# Altium footprint library CPU_v1.PcbLib: 56 footprints (part 1 of 4)
Each footprint in its own frame and in the unit in brackets; x right, y up, seen from the top. Pads: shape width x height; smd on the part's side, far side on the other; paste and mask are expansions set on the pad; w line width, h text height; cw(c..) or ccw(c..) is an arc to the next point about the centre after c.
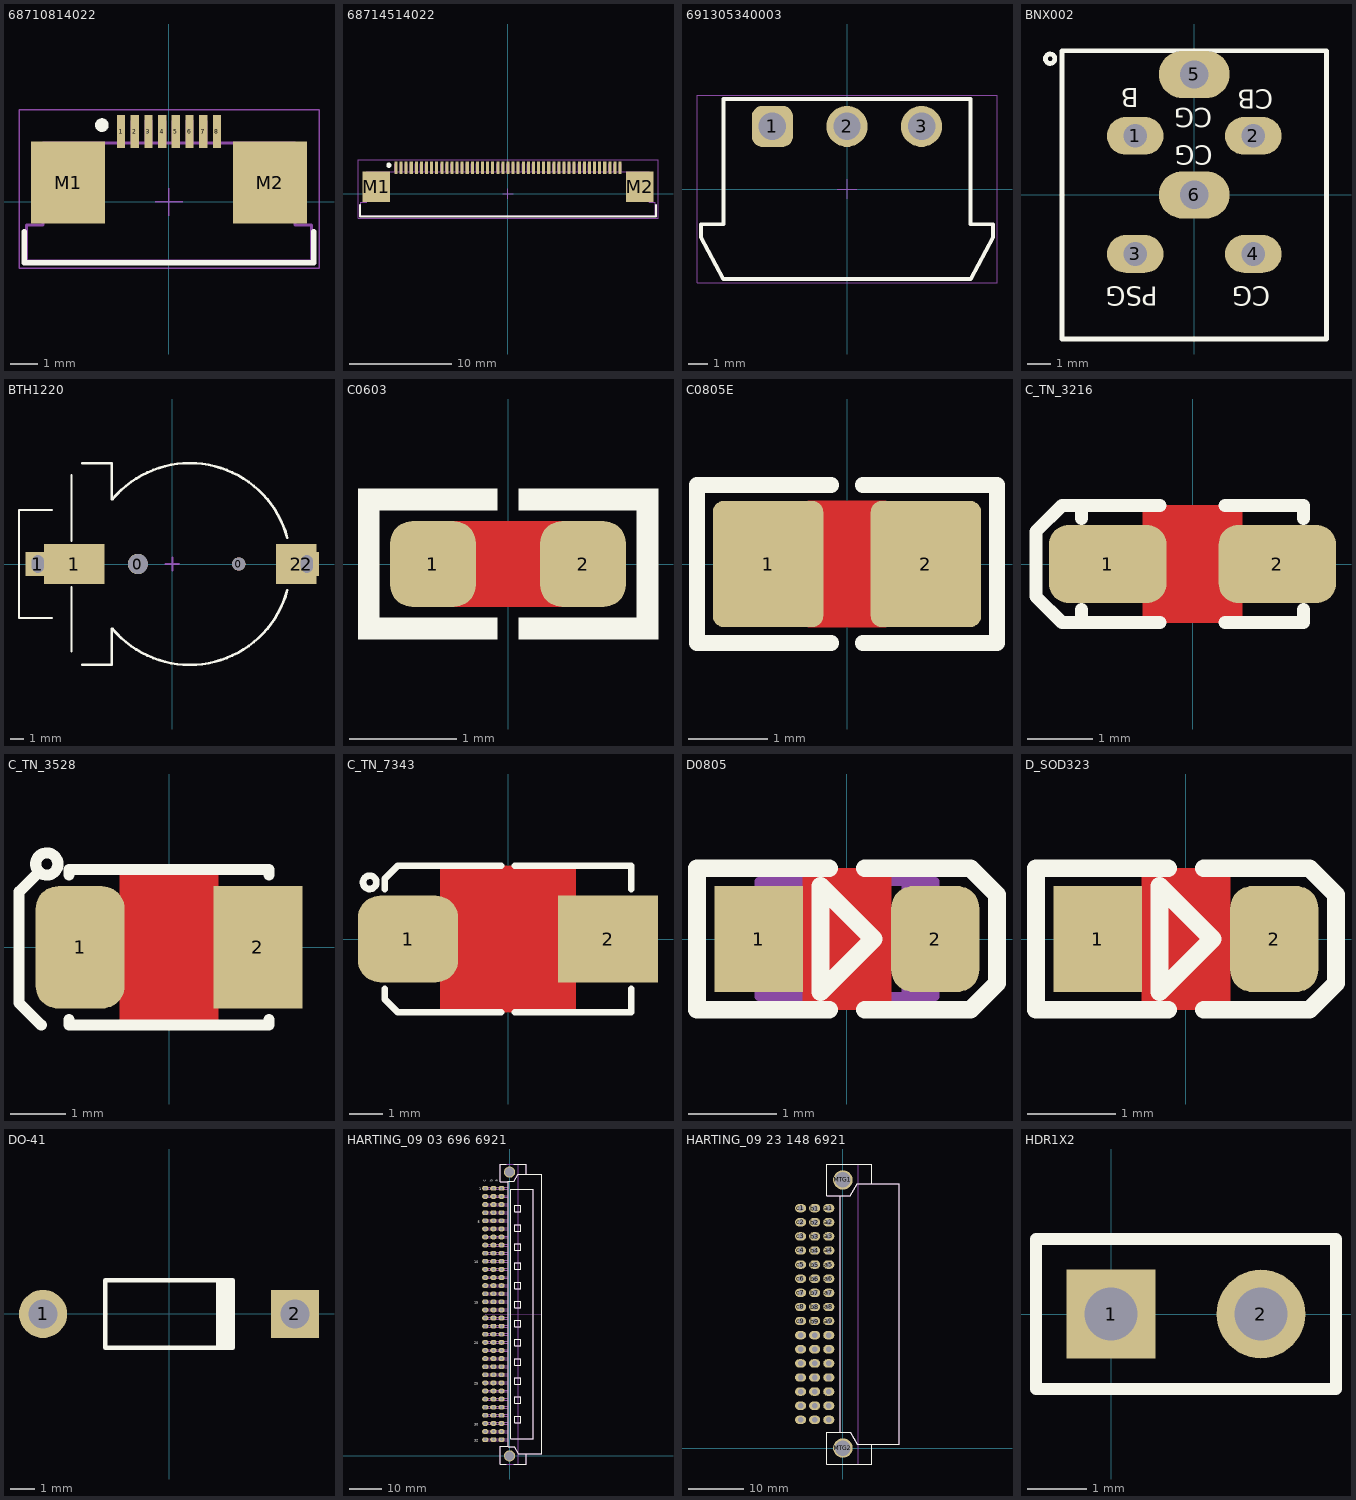
[diagram p0: the footprints below, top view; thin cyan lines are the x and y axes]

## 68710814022 [mm] "ZIF Connectors, Horizontal, Top Contact, pitch 0.5mm, 8p"
height 2.25
pads (10):
  rect 0.3x1.2 smd: 1(-1.75,2.56) 2(-1.25,2.56) 3(-0.75,2.56) 4(-0.25,2.56) 5(0.25,2.56) 6(0.75,2.56) 7(1.25,2.56) 8(1.75,2.56)
  rect 2.7x3 smd: M1(-3.68,0.7) M2(3.68,0.7)
Top Overlay:
  circle w0.25: c-2.45,2.8 r0.125
  lines w0.2: -5.275,-1.1 -5.275,-2.225 5.275,-2.225 5.275,-1.1
Top Designator:
  text ".Designator" at -2.917,-0.286 h0.8
Top Courtyard:
  lines w0.05: -0.5,0 0.5,0 ; 0,-0.5 0,0.5 ; -5.475,-2.425 5.475,-2.425 5.475,3.36 -5.475,3.36 -5.475,-2.425
Top 3D Body:
  lines w0.1: -1.85,2.15 -1.85,2.95 -1.65,2.95 -1.65,2.15 ; -1.35,2.15 -1.35,2.95 -1.15,2.95 -1.15,2.15 ; -0.85,2.15 -0.85,2.95 -0.65,2.95 -0.65,2.15 ; -0.35,2.15 -0.35,2.95 -0.15,2.95 -0.15,2.15 ; 0.15,2.15 0.15,2.95 0.35,2.95 0.35,2.15 ; 0.65,2.15 0.65,2.95 0.85,2.95 0.85,2.15 ; 1.15,2.15 1.15,2.95 1.35,2.95 1.35,2.15 ; 1.65,2.15 1.65,2.95 1.85,2.95 1.85,2.15 ; -5.2,-2.15 -5.2,-0.85 -4.6,-0.85 -4.6,2.15 4.6,2.15 4.6,-0.85 5.2,-0.85 5.2,-2.15 -5.2,-2.15
Top Component Outline:
  lines w0.1: -1.85,2.15 -1.85,2.95 -1.65,2.95 -1.65,2.15 ; -1.35,2.15 -1.35,2.95 -1.15,2.95 -1.15,2.15 ; -0.85,2.15 -0.85,2.95 -0.65,2.95 -0.65,2.15 ; -0.35,2.15 -0.35,2.95 -0.15,2.95 -0.15,2.15 ; 0.15,2.15 0.15,2.95 0.35,2.95 0.35,2.15 ; 0.65,2.15 0.65,2.95 0.85,2.95 0.85,2.15 ; 1.15,2.15 1.15,2.95 1.35,2.95 1.35,2.15 ; 1.65,2.15 1.65,2.95 1.85,2.95 1.85,2.15 ; -5.2,-2.15 5.2,-2.15 5.2,-0.85 4.6,-0.85 4.6,2.15 -4.6,2.15 -4.6,-0.85 -5.2,-0.85 -5.2,-2.15
3D body "68710814022.stp": height 2.1, standoff 0, extent -5.2,-2.15 5.2,2.95

## 68714514022 [mm] "ZIF Connectors, Horizontal, Top Contact, pitch 0.5mm, 45p"
height 2.25
pads (47):
  rect 0.3x1.2 smd: 1(-11,2.56) 2(-10.5,2.56) 3(-10,2.56) 4(-9.5,2.56) 5(-9,2.56) 6(-8.5,2.56) 7(-8,2.56) 8(-7.5,2.56) 9(-7,2.56) 10(-6.5,2.56) 11(-6,2.56) 12(-5.5,2.56) 13(-5,2.56) 14(-4.5,2.56) 15(-4,2.56) 16(-3.5,2.56) 17(-3,2.56) 18(-2.5,2.56) 19(-2,2.56) 20(-1.5,2.56) 21(-1,2.56) 22(-0.5,2.56) 23(0,2.56) 24(0.5,2.56) 25(1,2.56) 26(1.5,2.56) 27(2,2.56) 28(2.5,2.56) 29(3,2.56) 30(3.5,2.56) 31(4,2.56) 32(4.5,2.56) 33(5,2.56) 34(5.5,2.56) 35(6,2.56) 36(6.5,2.56) 37(7,2.56) 38(7.5,2.56) 39(8,2.56) 40(8.5,2.56) 41(9,2.56) 42(9.5,2.56) 43(10,2.56) 44(10.5,2.56) 45(11,2.56)
  rect 2.7x3 smd: M1(-12.93,0.7) M2(12.93,0.7)
Top Overlay:
  circle w0.25: c-11.7,2.8 r0.125
  lines w0.2: -14.525,-1.1 -14.525,-2.225 14.525,-2.225 14.525,-1.1
Top Designator:
  text ".Designator" at -2.917,-0.286 h0.8
Top Courtyard:
  lines w0.05: -0.5,0 0.5,0 ; 0,-0.5 0,0.5 ; -14.725,-2.425 14.725,-2.425 14.725,3.36 -14.725,3.36 -14.725,-2.425
Top 3D Body:
  lines w0.1: -11.1,2.15 -11.1,2.95 -10.9,2.95 -10.9,2.15 ; -10.6,2.15 -10.6,2.95 -10.4,2.95 -10.4,2.15 ; -10.1,2.15 -10.1,2.95 -9.9,2.95 -9.9,2.15 ; -9.6,2.15 -9.6,2.95 -9.4,2.95 -9.4,2.15 ; -9.1,2.15 -9.1,2.95 -8.9,2.95 -8.9,2.15 ; -8.6,2.15 -8.6,2.95 -8.4,2.95 -8.4,2.15 ; -8.1,2.15 -8.1,2.95 -7.9,2.95 -7.9,2.15 ; -7.6,2.15 -7.6,2.95 -7.4,2.95 -7.4,2.15 ; -7.1,2.15 -7.1,2.95 -6.9,2.95 -6.9,2.15 ; -6.6,2.15 -6.6,2.95 -6.4,2.95 -6.4,2.15 ; -6.1,2.15 -6.1,2.95 -5.9,2.95 -5.9,2.15 ; -5.6,2.15 -5.6,2.95 -5.4,2.95 -5.4,2.15 ; -5.1,2.15 -5.1,2.95 -4.9,2.95 -4.9,2.15 ; -4.6,2.15 -4.6,2.95 -4.4,2.95 -4.4,2.15 ; -4.1,2.15 -4.1,2.95 -3.9,2.95 -3.9,2.15 ; -3.6,2.15 -3.6,2.95 -3.4,2.95 -3.4,2.15 ; -3.1,2.15 -3.1,2.95 -2.9,2.95 -2.9,2.15 ; -2.6,2.15 -2.6,2.95 -2.4,2.95 -2.4,2.15 ; -2.1,2.15 -2.1,2.95 -1.9,2.95 -1.9,2.15 ; -1.6,2.15 -1.6,2.95 -1.4,2.95 -1.4,2.15 ; -1.1,2.15 -1.1,2.95 -0.9,2.95 -0.9,2.15 ; -0.6,2.15 -0.6,2.95 -0.4,2.95 -0.4,2.15 ; -0.1,2.15 -0.1,2.95 0.1,2.95 0.1,2.15 ; 0.4,2.15 0.4,2.95 0.6,2.95 0.6,2.15 ; 0.9,2.15 0.9,2.95 1.1,2.95 1.1,2.15 ; 1.4,2.15 1.4,2.95 1.6,2.95 1.6,2.15 ; 1.9,2.15 1.9,2.95 2.1,2.95 2.1,2.15 ; 2.4,2.15 2.4,2.95 2.6,2.95 2.6,2.15 ; 2.9,2.15 2.9,2.95 3.1,2.95 3.1,2.15 ; 3.4,2.15 3.4,2.95 3.6,2.95 3.6,2.15 ; 3.9,2.15 3.9,2.95 4.1,2.95 4.1,2.15 ; 4.4,2.15 4.4,2.95 4.6,2.95 4.6,2.15 ; 4.9,2.15 4.9,2.95 5.1,2.95 5.1,2.15 ; 5.4,2.15 5.4,2.95 5.6,2.95 5.6,2.15 ; 5.9,2.15 5.9,2.95 6.1,2.95 6.1,2.15 ; 6.4,2.15 6.4,2.95 6.6,2.95 6.6,2.15 ; 6.9,2.15 6.9,2.95 7.1,2.95 7.1,2.15 ; 7.4,2.15 7.4,2.95 7.6,2.95 7.6,2.15 ; 7.9,2.15 7.9,2.95 8.1,2.95 8.1,2.15 ; 8.4,2.15 8.4,2.95 8.6,2.95 8.6,2.15 ; 8.9,2.15 8.9,2.95 9.1,2.95 9.1,2.15 ; 9.4,2.15 9.4,2.95 9.6,2.95 9.6,2.15 ; 9.9,2.15 9.9,2.95 10.1,2.95 10.1,2.15 ; 10.4,2.15 10.4,2.95 10.6,2.95 10.6,2.15 ; 10.9,2.15 10.9,2.95 11.1,2.95 11.1,2.15 ; -14.45,-2.15 -14.45,-0.85 -13.85,-0.85 -13.85,2.15 13.85,2.15 13.85,-0.85 14.45,-0.85 14.45,-2.15 -14.45,-2.15
Top Component Outline:
  lines w0.1: -11.1,2.15 -11.1,2.95 -10.9,2.95 -10.9,2.15 ; -10.6,2.15 -10.6,2.95 -10.4,2.95 -10.4,2.15 ; -10.1,2.15 -10.1,2.95 -9.9,2.95 -9.9,2.15 ; -9.6,2.15 -9.6,2.95 -9.4,2.95 -9.4,2.15 ; -9.1,2.15 -9.1,2.95 -8.9,2.95 -8.9,2.15 ; -8.6,2.15 -8.6,2.95 -8.4,2.95 -8.4,2.15 ; -8.1,2.15 -8.1,2.95 -7.9,2.95 -7.9,2.15 ; -7.6,2.15 -7.6,2.95 -7.4,2.95 -7.4,2.15 ; -7.1,2.15 -7.1,2.95 -6.9,2.95 -6.9,2.15 ; -6.6,2.15 -6.6,2.95 -6.4,2.95 -6.4,2.15 ; -6.1,2.15 -6.1,2.95 -5.9,2.95 -5.9,2.15 ; -5.6,2.15 -5.6,2.95 -5.4,2.95 -5.4,2.15 ; -5.1,2.15 -5.1,2.95 -4.9,2.95 -4.9,2.15 ; -4.6,2.15 -4.6,2.95 -4.4,2.95 -4.4,2.15 ; -4.1,2.15 -4.1,2.95 -3.9,2.95 -3.9,2.15 ; -3.6,2.15 -3.6,2.95 -3.4,2.95 -3.4,2.15 ; -3.1,2.15 -3.1,2.95 -2.9,2.95 -2.9,2.15 ; -2.6,2.15 -2.6,2.95 -2.4,2.95 -2.4,2.15 ; -2.1,2.15 -2.1,2.95 -1.9,2.95 -1.9,2.15 ; -1.6,2.15 -1.6,2.95 -1.4,2.95 -1.4,2.15 ; -1.1,2.15 -1.1,2.95 -0.9,2.95 -0.9,2.15 ; -0.6,2.15 -0.6,2.95 -0.4,2.95 -0.4,2.15 ; -0.1,2.15 -0.1,2.95 0.1,2.95 0.1,2.15 ; 0.4,2.15 0.4,2.95 0.6,2.95 0.6,2.15 ; 0.9,2.15 0.9,2.95 1.1,2.95 1.1,2.15 ; 1.4,2.15 1.4,2.95 1.6,2.95 1.6,2.15 ; 1.9,2.15 1.9,2.95 2.1,2.95 2.1,2.15 ; 2.4,2.15 2.4,2.95 2.6,2.95 2.6,2.15 ; 2.9,2.15 2.9,2.95 3.1,2.95 3.1,2.15 ; 3.4,2.15 3.4,2.95 3.6,2.95 3.6,2.15 ; 3.9,2.15 3.9,2.95 4.1,2.95 4.1,2.15 ; 4.4,2.15 4.4,2.95 4.6,2.95 4.6,2.15 ; 4.9,2.15 4.9,2.95 5.1,2.95 5.1,2.15 ; 5.4,2.15 5.4,2.95 5.6,2.95 5.6,2.15 ; 5.9,2.15 5.9,2.95 6.1,2.95 6.1,2.15 ; 6.4,2.15 6.4,2.95 6.6,2.95 6.6,2.15 ; 6.9,2.15 6.9,2.95 7.1,2.95 7.1,2.15 ; 7.4,2.15 7.4,2.95 7.6,2.95 7.6,2.15 ; 7.9,2.15 7.9,2.95 8.1,2.95 8.1,2.15 ; 8.4,2.15 8.4,2.95 8.6,2.95 8.6,2.15 ; 8.9,2.15 8.9,2.95 9.1,2.95 9.1,2.15 ; 9.4,2.15 9.4,2.95 9.6,2.95 9.6,2.15 ; 9.9,2.15 9.9,2.95 10.1,2.95 10.1,2.15 ; 10.4,2.15 10.4,2.95 10.6,2.95 10.6,2.15 ; 10.9,2.15 10.9,2.95 11.1,2.95 11.1,2.15 ; -14.45,-2.15 14.45,-2.15 14.45,-0.85 13.85,-0.85 13.85,2.15 -13.85,2.15 -13.85,-0.85 -14.45,-0.85 -14.45,-2.15
3D body "68714514022.stp": height 2.1, standoff 0, extent -14.45,-2.15 14.45,2.95

## 691305340003 [mm] "Horizontal PCB Header with Plastic Latch, pitch 3.81mm, 03p"
height 7
pads (3):
  rrect50% 2.1x2.1 hole 1.4: 1(-3.81,3.2)
  round 2.1 hole 1.4: 2(0,3.2) 3(3.81,3.2)
Top Overlay:
  lines w0.2: -7.467,-2.451 -6.315,-4.6 6.315,-4.6 7.467,-2.451 ; -7.465,-2.45 -7.465,-1.8 -6.315,-1.8 -6.315,4.6 6.315,4.6 6.315,-1.8 7.465,-1.8 7.465,-2.45
Top Designator:
  text ".Designator" at -7.498,-0.5 h1.5
Top Courtyard:
  lines w0.05: -7.665,-4.8 7.665,-4.8 7.665,4.8 -7.665,4.8 -7.665,-4.8
Top 3D Body:
  lines w0.1: -7.467,-2.451 -6.315,-4.6 6.315,-4.6 7.467,-2.451 ; -7.465,-2.45 -7.465,-1.8 -6.315,-1.8 -6.315,4.6 6.315,4.6 6.315,-1.8 7.465,-1.8 7.465,-2.45
Top Component Center:
  lines w0.05: -0.5,0 0.5,0 ; 0,-0.5 0,0.5
Top Component Outline:
  lines w0.1: -7.467,-2.451 -6.315,-4.6 6.315,-4.6 7.467,-2.451 ; -7.465,-2.45 -7.465,-1.8 -6.315,-1.8 -6.315,4.6 6.315,4.6 6.315,-1.8 7.465,-1.8 7.465,-2.45
3D body "691305340003.stp": height 7.25, standoff -3.45, extent -7.46,-4.6 7.46,4.6

## BNX002 [mm] "MURATA EMIFIL"
height 15
pads (6):
  oval 2.4x1.6 hole 1: 1(-2.5,2.5) 2(2.5,2.5) 3(-2.5,-2.5) 4(2.5,-2.5)
  oval 3x2 hole 1.2: 5(0,5.1) 6(0,0)
Top Overlay:
  circle w0.2: c-6.102,5.764 r0.2
  lines w0.2: -5.6,-6.1 5.6,-6.1 5.6,6.1 -5.6,6.1 -5.6,-6.1
  text "CG" at 0.758,3.671 h0.8
  text "CG" at 0.783,2.071 h0.8
  text "PSG" at -1.554,-3.898 h0.8
  text "CG" at 3.222,-3.898 h0.8
  text "CB" at 3.349,4.458 h0.8
  text "B" at -2.341,4.509 h0.8
3D body "User Library-Murata_BNX002.STEP": height 12.5, standoff -5, extent -5.5,-6 5.5,6

## BTH1220 [mm] "COIN CELL BATTERY HOLDER 1220 12mm CR1220"
height 2
pads (6):
  round 1.5 hole 1.5 unplated: 0(-2.563,0)
  round 1 hole 1 unplated: 0(4.93,0)
  rect 1.8x1.8 hole 0.9 slot 1.3 at 90 deg: 1(-10,0) 2(10,0)
  rect 4.5x3 smd: 1(-7.3,0)
  rect 3x3 smd: 2(9.2,0)
Top Overlay:
  lines w0.15: -8.962,4 -11.4,4 -11.4,-4 -8.954,-4 ; -7.5,-6.5 -7.5,-1.7 ; -7.5,1.7 -7.5,6.6
  lines w0.2: -6.7,-7.5 -4.5,-7.5 -4.5,-4.821 ; -6.7,7.5 -4.5,7.5 -4.5,4.821 ; -4.445,-4.821 ccw(c1.3,0) 8.544,-1.941 ; -4.445,4.821 cw(c1.3,0) 8.544,1.941
Mechanical 15:
  lines w0.15: -0.5,0 0.5,0 ; 0,-0.5 0,0.5
3D body "User Library-Battery Holder for CR1220 SMD.step": height 4.28, standoff -0.47, extent -8.46,-7.389 10.341,7.36

## C0603 [mm] "CHIP Capacitor, 1.6X0.8mm, 0603 OPTIMIZED"
height 0.6
pads (2):
  rrect50% 0.8x0.8 smd paste-5 mask+0.075: 1(-0.7,0) 2(0.7,0)
Top Layer:
  pour cut-out: -0.5,0.4 0.5,0.4 0.5,-0.4 -0.5,-0.4
Top Overlay:
  region: 0.1,-0.5 0.1,-0.7 1.4,-0.7 1.4,-0.5
  region: 0.1,0.5 0.1,0.7 1.4,0.7 1.4,0.5
  region: 1.4,0.7 1.2,0.7 1.2,-0.7 1.4,-0.7
  region: -1.4,0.7 -1.2,0.7 -1.2,-0.7 -1.4,-0.7
  region: -0.1,0.5 -0.1,0.7 -1.4,0.7 -1.4,0.5
  region: -0.1,-0.5 -0.1,-0.7 -1.4,-0.7 -1.4,-0.5
Top Paste:
  region: -0.7,0.35 -0.63,0.35 -0.502,0.297 -0.403,0.198 -0.35,0.07 -0.35,0 -0.35,-0.07 -0.403,-0.198 -0.502,-0.297 -0.63,-0.35 -0.7,-0.35 -0.9,-0.35 -0.93,-0.35 -0.985,-0.327 -1.027,-0.285 -1.05,-0.23 -1.05,-0.2 -1.05,0.2 -1.05,0.23 -1.027,0.285 -0.985,0.327 -0.93,0.35 -0.9,0.35
  region: 0.7,0.35 0.63,0.35 0.502,0.297 0.403,0.198 0.35,0.07 0.35,0 0.35,-0.07 0.403,-0.198 0.502,-0.297 0.63,-0.35 0.7,-0.35 0.9,-0.35 0.93,-0.35 0.985,-0.327 1.027,-0.285 1.05,-0.23 1.05,-0.2 1.05,0.2 1.05,0.23 1.027,0.285 0.985,0.327 0.93,0.35 0.9,0.35
3D body "User Library-CAPC1608X09.step": height 0.9, standoff 0, extent -0.8,-0.4 0.8,0.4

## C0805E [mm] "CHIP Capacitor, 2.0X1.3mm, 0805, EXPANDED PAD"
height 2.25
pads (2):
  rrect20% 1.4x1.6 smd mask+0.1: 1(-1,0) 2(1,0)
Top Layer:
  pour cut-out: -0.5,0.8 0.5,0.8 0.5,-0.8 -0.5,-0.8
Top Overlay:
  lines w0.2: -0.2,-1 -1.9,-1 -1.9,1 -0.2,1 ; 0.2,-1 1.9,-1 1.9,1 0.2,1
3D body "User Library-CAPC2013X10.step": height 1, standoff 0, extent -1,-0.625 1,0.625

## C_TN_3216 [mm] "CAPACITOR, TAN A, 1206P, 3.2x1.6mm"
height 1.8
pads (2):
  rrect50% 1.8x1.2 smd mask+0.075: 1(-1.3,0) 2(1.3,0)
Top Layer:
  pour cut-out: -0.762,0.9 0.762,0.9 0.762,-0.9 -0.762,-0.9
Top Overlay:
  lines w0.2: -1.7,-0.7 -1.7,-0.9 ; -1.7,0.7 -1.7,0.9 ; -0.5,-0.9 -1.7,-0.9 ; -0.5,0.9 -1.7,0.9 ; 0.5,-0.9 1.7,-0.9 1.7,-0.7 ; 0.5,0.9 1.7,0.9 1.7,0.7 ; -1.7,-0.9 -2,-0.9 -2.4,-0.5 -2.4,0.5 -2,0.9 -1.7,0.9
3D body "User Library-CAP_TANT_3216-18_A_case-1.step": height 1.7, standoff 0, extent -1.7,-0.9 1.7,0.9

## C_TN_3528 [mm] "CAPACITOR, TAN B, TAN H, TAN T, TAN M, 3528P, 1210P, 3.5X2.8mm"
height 13.1
pads (2):
  rrect50% 1.6x2.2 smd mask+0.1: 1(-1.6,0)
  rect 1.6x2.2 smd mask+0.1: 2(1.6,0)
Top Layer:
  pour cut-out: -0.889,1.4 -0.889,-1.4 0.889,-1.4 0.889,1.4
Top Overlay:
  circle w0.2: c-2.2,1.5 r0.2
  lines w0.2: -2.35,1.35 -2.7,1 -2.7,-1 -2.3,-1.4 ; -1.8,-1.3 -1.8,-1.4 1.8,-1.4 1.8,-1.3 ; -1.8,1.3 -1.8,1.4 1.8,1.4 1.8,1.3
3D body "User Library-AVX_BCASE.step": height 2.03, standoff 0, extent -1.85,-1.465 1.85,1.465

## C_TN_7343 [mm] "CAPACITOR, TAN D, TAN E, TAN Y, TAN X, 7343P, 7.3X4.3mm"
height 4.3
pads (2):
  rrect50% 3x2.6 smd: 1(-3,0)
  rect 3x2.6 smd: 2(3,0)
Top Layer:
  pour cut-out: -2.032,2.2 -2.032,-2.2 2.032,-2.2 2.032,2.2
Top Overlay:
  circle w0.2: c-4.15,1.7 r0.2
  lines w0.2: -3.7,-1.5 -3.7,-1.8 -3.3,-2.2 -0.2,-2.2 ; -3.7,1.5 -3.7,1.8 -3.3,2.2 -0.2,2.2 ; 0.2,-2.2 3.7,-2.2 3.7,-1.5 ; 0.2,2.2 3.7,2.2 3.7,1.5
3D body "User Library-AVX_E_CASE.step": height 4.2, standoff 0, extent -3.7,-2.225 3.701,2.225

## D0805 [mm] "DIODE0805, SOD323 (PHILIPS), SC-76 (JEITA), DL-35, MicroMELF"
height 1.4
pads (2):
  rect 1x1.2 smd paste-2 mask+0.075: 1(-1,0)
  rrect50% 1x1.2 smd paste-2 mask+0.075: 2(1,0)
Top Layer:
  pour cut-out: -0.5,0.8 0.5,0.8 0.5,-0.8 -0.5,-0.8
Top Overlay:
  lines w0.2: -0.2,-0.8 -1.7,-0.8 -1.7,0.8 -0.2,0.8 ; 0.2,-0.8 1.4,-0.8 1.7,-0.5 1.7,0.5 1.4,0.8 0.2,0.8 ; -0.3,-0.6 -0.3,0.6 0.3,0 -0.3,-0.6
Top Paste:
  region: -0.9,0.5 -0.82,0.5 -0.673,0.439 -0.561,0.327 -0.5,0.18 -0.5,0.1 -0.5,-0.1 -0.5,-0.18 -0.561,-0.327 -0.673,-0.439 -0.82,-0.5 -0.9,-0.5 -1.15,-0.5 -1.18,-0.5 -1.235,-0.477 -1.277,-0.435 -1.3,-0.38 -1.3,-0.35 -1.3,0.35 -1.3,0.38 -1.277,0.435 -1.235,0.477 -1.18,0.5 -1.15,0.5
  region: 0.9,0.5 0.82,0.5 0.673,0.439 0.561,0.327 0.5,0.18 0.5,0.1 0.5,-0.1 0.5,-0.18 0.561,-0.327 0.673,-0.439 0.82,-0.5 0.9,-0.5 1.15,-0.5 1.18,-0.5 1.235,-0.477 1.277,-0.435 1.3,-0.38 1.3,-0.35 1.3,0.35 1.3,0.38 1.277,0.435 1.235,0.477 1.18,0.5 1.15,0.5
Mechanical 13:
  rectangle: -0.848,-0.65 -0.619,0.65
  rectangle: -0.995,0.193 -0.842,0.652
  rectangle: -0.995,-0.648 -0.842,-0.188
  region: 0.848,0.65 0.619,0.65 0.619,-0.65 0.848,-0.65
  region: 0.995,0.648 0.842,0.648 0.842,0.188 0.995,0.188
  region: 0.995,-0.193 0.842,-0.193 0.842,-0.652 0.995,-0.652
  lines w0.102: -0.305,0.356 -0.076,0.025 -0.33,0 -0.076,-0.33 ; 0.102,0.356 0.33,0.025 0.076,0 0.33,-0.33 ; -0.076,-0.33 -0.076,-0.178 -0.229,-0.279 -0.076,-0.33 ; 0.33,-0.33 0.33,-0.178 0.178,-0.279 0.33,-0.33 ; -1,-0.65 1,-0.65 1,-0.19 cw(c1,0) 1,0.191 1,0.65 -1,0.65 -1,0.191 cw(c-1,0) -1,-0.191 -1,-0.65
3D body "SOD-323.STEP": height 1.17, standoff 0.03, extent -1.43,-0.8 1.43,0.7

## D_SOD323 [mm] "DIODE0805, SOD-323, SC-76, DL-35, 0805 similar size"
height 1.4
pads (2):
  rect 1x1.2 smd paste-2 mask+0.075: 1(-1,0)
  rrect50% 1x1.2 smd paste-2 mask+0.075: 2(1,0)
Top Layer:
  pour cut-out: -0.5,0.8 0.5,0.8 0.5,-0.8 -0.5,-0.8
Top Overlay:
  lines w0.2: -0.2,-0.8 -1.7,-0.8 -1.7,0.8 -0.2,0.8 ; 0.2,-0.8 1.4,-0.8 1.7,-0.5 1.7,0.5 1.4,0.8 0.2,0.8 ; -0.3,-0.6 -0.3,0.6 0.3,0 -0.3,-0.6
Top Paste:
  region: 0.9,0.5 0.82,0.5 0.673,0.439 0.561,0.327 0.5,0.18 0.5,0.1 0.5,-0.1 0.5,-0.18 0.561,-0.327 0.673,-0.439 0.82,-0.5 0.9,-0.5 1.15,-0.5 1.18,-0.5 1.235,-0.477 1.277,-0.435 1.3,-0.38 1.3,-0.35 1.3,0.35 1.3,0.38 1.277,0.435 1.235,0.477 1.18,0.5 1.15,0.5
  region: -0.9,0.5 -0.82,0.5 -0.673,0.439 -0.561,0.327 -0.5,0.18 -0.5,0.1 -0.5,-0.1 -0.5,-0.18 -0.561,-0.327 -0.673,-0.439 -0.82,-0.5 -0.9,-0.5 -1.15,-0.5 -1.18,-0.5 -1.235,-0.477 -1.277,-0.435 -1.3,-0.38 -1.3,-0.35 -1.3,0.35 -1.3,0.38 -1.277,0.435 -1.235,0.477 -1.18,0.5 -1.15,0.5
3D body "SOD323F.STEP": height 1, standoff 0, extent -1.25,-0.675 1.25,0.675

## DO-41 [mm] "Diode, Axial; Body 5.2 x 2.7 mm (LxDia. max), Lead Dia. 0.86 mm (max)"
height 2.8
pads (2):
  round 2 hole 1.2: 1(-5.23,0)
  rect 2x2 hole 1.2: 2(5.23,0)
Top Overlay:
  rectangle: 1.946,-1.402 2.746,1.398
  lines w0.2: 2.65,-1.4 -2.65,-1.4 -2.65,1.4 2.65,1.4

## HARTING_09 03 696 6921 [mm] "DIN 41612, Type C, Thru-Hole;  Rows a+b+c, 96 Position, Performance level 2, Lead 3.0 mm, Pitch 2.54mm, Right Angle Male Connector With Coding"
height 13.1
pads (98):
  oval 2x1.5 hole 1: a1(-2.54,83.82) a2(-2.54,81.28) a3(-2.54,78.74) a4(-2.54,76.2) a5(-2.54,73.66) a6(-2.54,71.12) a7(-2.54,68.58) a8(-2.54,66.04) a9(-2.54,63.5) a10(-2.54,60.96) a11(-2.54,58.42) a12(-2.54,55.88) a13(-2.54,53.34) a14(-2.54,50.8) a15(-2.54,48.26) a16(-2.54,45.72) a17(-2.54,43.18) a18(-2.54,40.64) a19(-2.54,38.1) a20(-2.54,35.56) a21(-2.54,33.02) a22(-2.54,30.48) a23(-2.54,27.94) a24(-2.54,25.4) a25(-2.54,22.86) a26(-2.54,20.32) a27(-2.54,17.78) a28(-2.54,15.24) a29(-2.54,12.7) a30(-2.54,10.16) a31(-2.54,7.62) a32(-2.54,5.08) b1(-5.08,83.82) b2(-5.08,81.28) b3(-5.08,78.74) b4(-5.08,76.2) b5(-5.08,73.66) b6(-5.08,71.12) b7(-5.08,68.58) b8(-5.08,66.04) b9(-5.08,63.5) b10(-5.08,60.96) b11(-5.08,58.42) b12(-5.08,55.88) b13(-5.08,53.34) b14(-5.08,50.8) b15(-5.08,48.26) b16(-5.08,45.72) b17(-5.08,43.18) b18(-5.08,40.64) b19(-5.08,38.1) b20(-5.08,35.56) b21(-5.08,33.02) b22(-5.08,30.48) b23(-5.08,27.94) b24(-5.08,25.4) b25(-5.08,22.86) b26(-5.08,20.32) b27(-5.08,17.78) b28(-5.08,15.24) b29(-5.08,12.7) b30(-5.08,10.16) b31(-5.08,7.62) b32(-5.08,5.08) c1(-7.62,83.82) c2(-7.62,81.28) c3(-7.62,78.74) c4(-7.62,76.2) c5(-7.62,73.66) c6(-7.62,71.12) c7(-7.62,68.58) c8(-7.62,66.04) c9(-7.62,63.5) c10(-7.62,60.96) c11(-7.62,58.42) c12(-7.62,55.88) c13(-7.62,53.34) c14(-7.62,50.8) c15(-7.62,48.26) c16(-7.62,45.72) c17(-7.62,43.18) c18(-7.62,40.64) c19(-7.62,38.1) c20(-7.62,35.56) c21(-7.62,33.02) c22(-7.62,30.48) c23(-7.62,27.94) c24(-7.62,25.4) c25(-7.62,22.86) c26(-7.62,20.32) c27(-7.62,17.78) c28(-7.62,15.24) c29(-7.62,12.7) c30(-7.62,10.16) c31(-7.62,7.62) c32(-7.62,5.08)
  round 3.5 / inner round 3.5 / far side round 5.1 hole 2.8: MTG1(0,88.9) MTG2(0,0)
Top Overlay:
  lines w0.2: -1.04,-2.55 -2.9,-2.55 -2.9,3 -0.5,3 ; -1.04,91.45 -2.9,91.45 -2.9,85.9 -0.5,85.9 ; 1.26,-2.55 5.15,-2.55 5.15,0.7 ; 1.26,91.45 5.15,91.45 5.15,88.2 ; -0.5,2.85 1.512,2.85 2.753,0.7 10.1,0.7 10.1,88.2 2.768,88.2 1.527,86.05 -0.5,86.05 -0.5,2.85 ; 0.37,5.425 7.4,5.425 7.4,83.475 0.37,83.475 0.37,5.425 ; 1.57,10.425 3.42,10.425 3.42,12.475 1.57,12.475 1.57,10.425 ; 1.57,16.425 3.42,16.425 3.42,18.475 1.57,18.475 1.57,16.425 ; 1.57,22.425 3.42,22.425 3.42,24.475 1.57,24.475 1.57,22.425 ; 1.57,28.425 3.42,28.425 3.42,30.475 1.57,30.475 1.57,28.425 ; 1.57,34.425 3.42,34.425 3.42,36.475 1.57,36.475 1.57,34.425 ; 1.57,40.425 3.42,40.425 3.42,42.475 1.57,42.475 1.57,40.425 ; 1.57,46.425 3.42,46.425 3.42,48.475 1.57,48.475 1.57,46.425 ; 1.57,52.425 3.42,52.425 3.42,54.475 1.57,54.475 1.57,52.425 ; 1.57,58.425 3.42,58.425 3.42,60.475 1.57,60.475 1.57,58.425 ; 1.57,64.425 3.42,64.425 3.42,66.475 1.57,66.475 1.57,64.425 ; 1.57,70.425 3.42,70.425 3.42,72.475 1.57,72.475 1.57,70.425 ; 1.57,76.425 3.42,76.425 3.42,78.475 1.57,78.475 1.57,76.425
  text "a" at -3.715,85.87 h0.8
  text "b" at -5.29,85.9 h0.8
  text "c" at -7.44,85.845 h0.8
  text "1" at -9.585,83.27 h0.8
  text "32" at -11.11,4.43 h0.8
  text "5" at -9.985,72.96 h0.8
  text "10" at -11.035,60.31 h0.8
  text "15" at -11.01,47.71 h0.8
  text "20" at -11.11,34.91 h0.8
  text "25" at -11.11,22.21 h0.8
  text "30" at -11.11,9.51 h0.8
Mechanical 8:
  drawing of 394 lines, arcs and shapes, not listed
  text "PCB" at 2.54,42.545 h0.8
Mechanical 14:
  drawing of 166 lines, arcs and shapes, not listed
  text "1" at -9.585,83.27 h0.8
  text "32" at -11.11,4.43 h0.8
  text "5" at -9.985,72.96 h0.8
  text "10" at -11.035,60.31 h0.8
  text "15" at -11.01,47.71 h0.8
  text "20" at -11.11,34.91 h0.8
  text "25" at -11.11,22.21 h0.8
  text "30" at -11.11,9.51 h0.8
  text "c" at -7.44,85.845 h0.8
  text "b" at -5.29,85.9 h0.8
  text "a" at -3.715,85.87 h0.8
  text "c" at -6.985,83.185 h0.8
  text "a" at -1.905,83.185 h0.8
3D body "HARTING_09 03 696 6921.stp": height 11.45, standoff -3, extent -7.92,-2.55 10.1,91.45

## HARTING_09 23 148 6921 [mm] "DIN 41612, Type 2C, Thru-Hole;  Rows a+b+c, 48 Position, Performance level 2, Lead 3.0 mm, Pitch 2.54mm, Right Angle Male Connector"
height 11
pads (50):
  oval 2x1.5 hole 1: a1(-2.54,43.18) a2(-2.54,40.64) a3(-2.54,38.1) a4(-2.54,35.56) a5(-2.54,33.02) a6(-2.54,30.48) a7(-2.54,27.94) a8(-2.54,25.4) a9(-2.54,22.86) a10(-2.54,20.32) a11(-2.54,17.78) a12(-2.54,15.24) a13(-2.54,12.7) a14(-2.54,10.16) a15(-2.54,7.62) a16(-2.54,5.08) b1(-5.08,43.18) b2(-5.08,40.64) b3(-5.08,38.1) b4(-5.08,35.56) b5(-5.08,33.02) b6(-5.08,30.48) b7(-5.08,27.94) b8(-5.08,25.4) b9(-5.08,22.86) b10(-5.08,20.32) b11(-5.08,17.78) b12(-5.08,15.24) b13(-5.08,12.7) b14(-5.08,10.16) b15(-5.08,7.62) b16(-5.08,5.08) c1(-7.62,43.18) c2(-7.62,40.64) c3(-7.62,38.1) c4(-7.62,35.56) c5(-7.62,33.02) c6(-7.62,30.48) c7(-7.62,27.94) c8(-7.62,25.4) c9(-7.62,22.86) c10(-7.62,20.32) c11(-7.62,17.78) c12(-7.62,15.24) c13(-7.62,12.7) c14(-7.62,10.16) c15(-7.62,7.62) c16(-7.62,5.08)
  round 3.5 / inner round 3.5 / far side round 5.1 hole 2.8: MTG1(0,48.26) MTG2(0,0)
Top Overlay:
  lines w0.2: -0.5,2.85 -0.5,45.41 ; 5.15,0.68 5.15,-2.87 -2.9,-2.87 -2.9,2.85 1.357,2.85 2.61,0.68 10.1,0.68 10.1,47.58 2.61,47.58 1.357,45.41 -2.9,45.41 -2.9,51.13 5.15,51.13 5.15,47.58
Mechanical 8:
  lines w0.1: -8.12,5.08 -7.62,5.08 ; -8.12,43.18 -7.62,43.18 ; -7.62,4.58 -7.62,5.08 ; -7.62,5.58 -7.62,5.08 ; -7.62,42.68 -7.62,43.18 ; -7.62,43.68 -7.62,43.18 ; -7.12,5.08 -7.62,5.08 ; -7.12,43.18 -7.62,43.18 ; -5.58,5.08 -5.08,5.08 ; -5.58,43.18 -5.08,43.18 ; -5.08,4.58 -5.08,5.08 ; -5.08,5.58 -5.08,5.08 ; -5.08,42.68 -5.08,43.18 ; -5.08,43.68 -5.08,43.18 ; -4.58,5.08 -5.08,5.08 ; -4.58,43.18 -5.08,43.18 ; -3.04,5.08 -2.54,5.08 ; -3.04,43.18 -2.54,43.18 ; -2.54,4.58 -2.54,5.08 ; -2.54,5.58 -2.54,5.08 ; -2.54,42.68 -2.54,43.18 ; -2.54,43.68 -2.54,43.18 ; -2.04,5.08 -2.54,5.08 ; -2.04,43.18 -2.54,43.18 ; -0.5,0 0,0 ; -0.5,48.26 0,48.26 ; 0,-0.5 0,0 ; 0,0.5 0,0 ; 0,47.76 0,48.26 ; 0,48.76 0,48.26 ; 0.5,0 0,0 ; 0.5,48.26 0,48.26 ; 2.76,-2.87 2.76,24.13 2.76,51.13
Mechanical 14:
  circle w0.1: c0,0 r1.25
  circle w0.1: c0,48.26 r1.25
  lines w0.1: -0.5,2.85 -0.5,45.41 ; 5.15,0.68 5.15,-2.87 -2.9,-2.87 -2.9,2.85 1.357,2.85 2.61,0.68 10.1,0.68 10.1,47.58 2.61,47.58 1.357,45.41 -2.9,45.41 -2.9,51.13 5.15,51.13 5.15,47.58
3D body "HARTING_09 23 148 6921.stp": height 9.35, standoff -3, extent -7.87,-2.87 10.1,51.13

## HDR1X2 [mm] "Connector; Header; 2 Position"
height 11.6
pads (2):
  rect 1.5x1.5 hole 0.9: 1(0,0)
  round 1.5 hole 0.9: 2(2.54,0)
Top Overlay:
  lines w0.2: -1.27,-1.27 -1.27,1.27 3.81,1.27 3.81,-1.27 -1.27,-1.27